# Altium footprint library PR_COR.PcbLib: 73 footprints (part 2 of 5)
Each footprint in its own frame and in the unit in brackets; x right, y up, seen from the top. Pads: shape width x height; smd on the part's side, far side on the other; paste and mask are expansions set on the pad; w line width, h text height; cw(c..) or ccw(c..) is an arc to the next point about the centre after c.
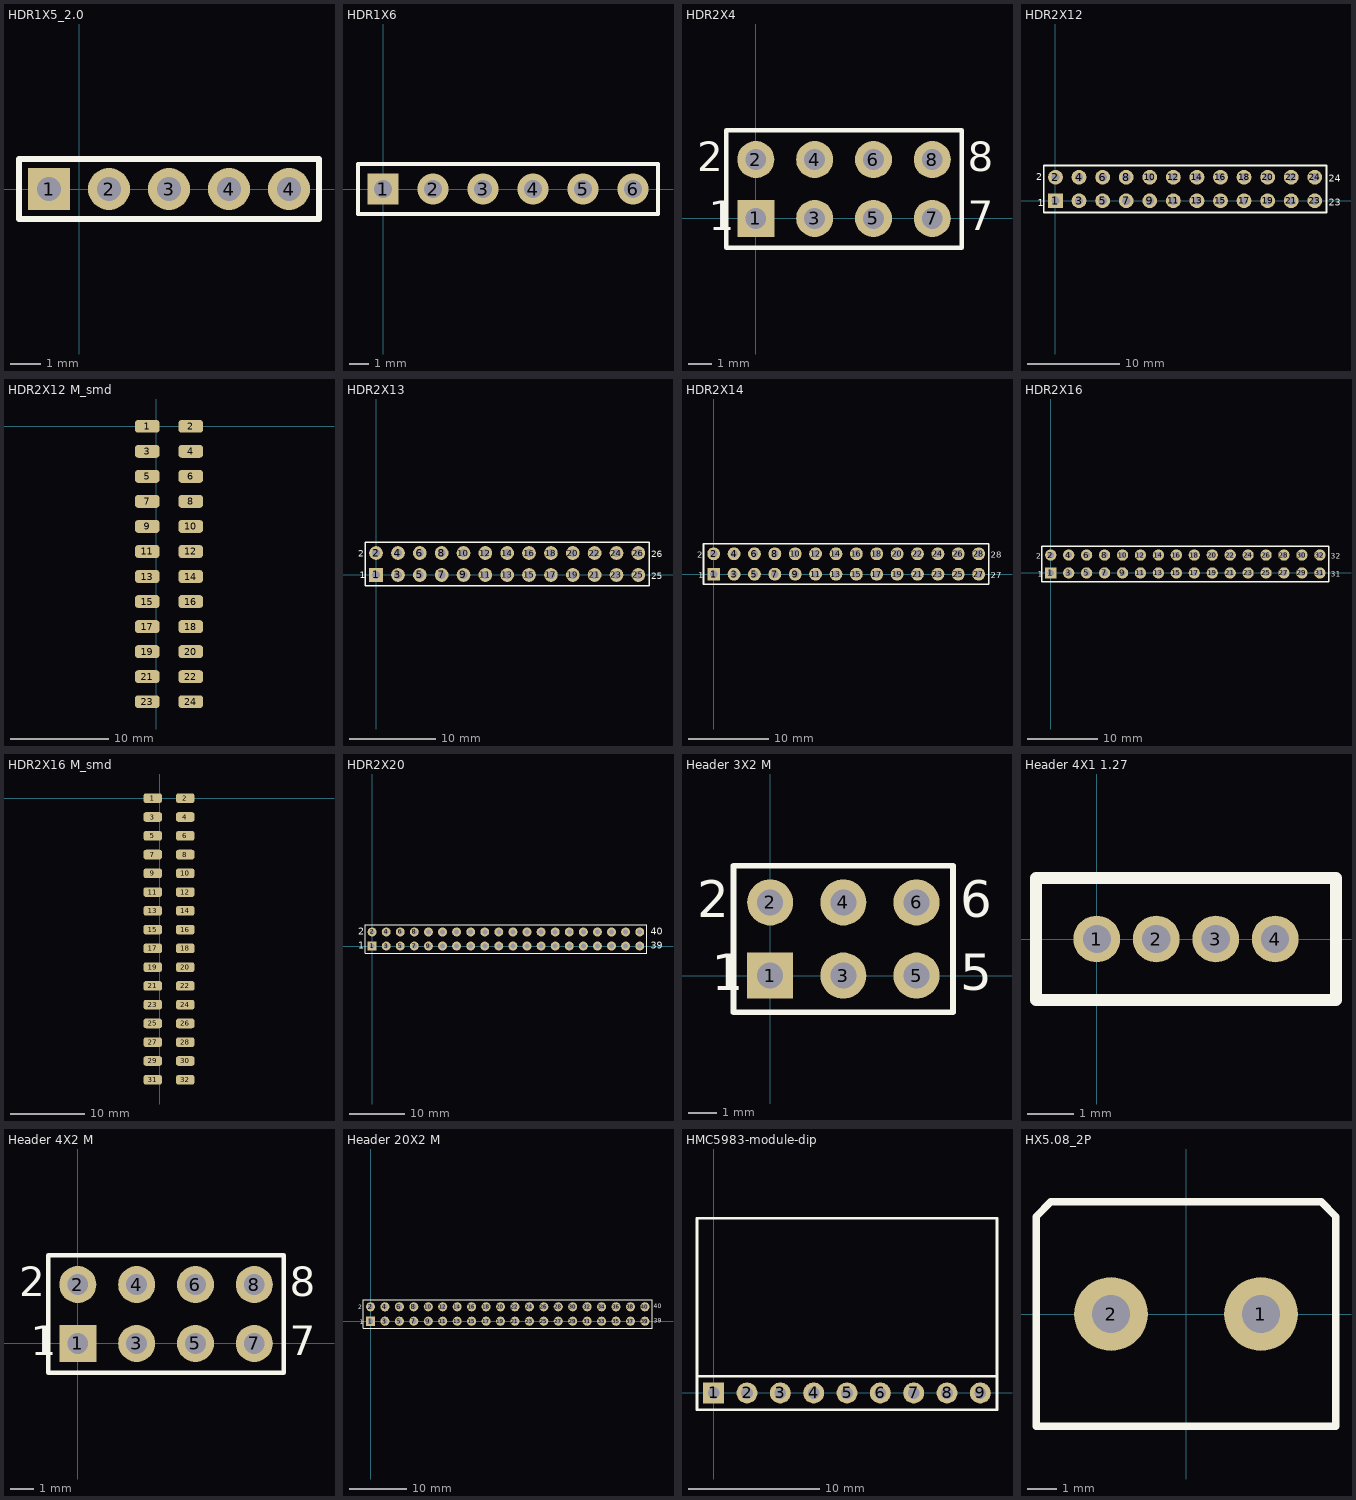
[diagram p1: the footprints below, top view; thin cyan lines are the x and y axes]

## HDR1X5_2.0 [mm] "Connector; Header; 2 Position"
pads (5):
  rect 1.4x1.4 hole 0.8: 1(-1,0)
  round 1.4 hole 0.8: 2(1,0) 3(3,0) 4(5,0) 4(7,0)
Top Overlay:
  lines w0.2: -2,-1 8,-1 8,1 -2,1 -2,-1
3D body: height 5.82, standoff -2.78, extent -2,-1 8,1

## HDR1X6 [mm] "Connector; Header; 6 Position"
pads (6):
  rect 1.6x1.6 hole 0.9: 1(0,0)
  round 1.6 hole 0.9: 2(2.54,0) 3(5.08,0) 4(7.62,0) 5(10.16,0) 6(12.7,0)
Top Overlay:
  lines w0.2: -1.27,-1.27 13.97,-1.27 13.97,1.27 -1.27,1.27 -1.27,-1.27
3D body: height 8.02, standoff -2.98, extent -1.27,-1.27 13.97,1.27

## HDR2X4 [mm] "Connector; Header; 4x2 Position"
pads (8):
  rect 1.6x1.6 hole 0.9: 1(0,0)
  round 1.6 hole 0.9: 2(0,2.54) 3(2.54,0) 4(2.54,2.54) 5(5.08,0) 6(5.08,2.54) 7(7.62,0) 8(7.62,2.54)
Top Overlay:
  lines w0.2: -1.27,-1.27 -1.27,3.81 8.89,3.81 8.89,-1.27 -1.27,-1.27
  text "8" at 9.144,2.032 h1.27
  text "7" at 9.144,-0.508 h1.27
  text "1" at -2.032,-0.508 h1.27
  text "2" at -2.54,2.032 h1.27
3D body: height 7.72, standoff -3.28, extent -1.27,-1.27 8.89,3.81

## HDR2X12 [mm] "Connector; Header; 12x2 Position"
pads (24):
  rect 1.6x1.6 hole 0.9: 1(0,0)
  round 1.6 hole 0.9: 2(0,2.54) 3(2.54,0) 4(2.54,2.54) 5(5.08,0) 6(5.08,2.54) 7(7.62,0) 8(7.62,2.54) 9(10.16,0) 10(10.16,2.54) 11(12.7,0) 12(12.7,2.54) 13(15.24,0) 14(15.24,2.54) 15(17.78,0) 16(17.78,2.54) 17(20.32,0) 18(20.32,2.54) 19(22.86,0) 20(22.86,2.54) 21(25.4,0) 22(25.4,2.54) 23(27.94,0) 24(27.94,2.54)
Top Overlay:
  lines w0.2: -1.27,-1.27 -1.27,3.81 29.21,3.81 29.21,-1.27 -1.27,-1.27
  text "1" at -1.9,-0.6 h0.76
  text "2" at -2.1,2.2 h0.76
  text "23" at 29.464,-0.508 h0.76
  text "24" at 29.464,2.032 h0.76
Bottom Overlay:
  lines w0.2: -1.27,-1.27 29.21,-1.27 29.21,3.81 -1.27,3.81 -1.27,-1.27
  text "24" at 30.76,2.01 h0.76
  text "23" at 30.75,-0.49 h0.76
  text "2" at -1.6,2.2 h0.76
  text "1" at -1.72,-0.62 h0.76
3D body: height 8.02, standoff -2.98, extent -1.27,-1.27 29.21,3.81

## HDR2X12 M_smd [mm]
pads (24):
  rrect50% 2.5x1.3 smd: 1(-0.93,0) 2(3.47,0) 3(-0.93,-2.54) 4(3.47,-2.54) 5(-0.93,-5.08) 6(3.47,-5.08) 7(-0.93,-7.62) 8(3.47,-7.62) 9(-0.93,-10.16) 10(3.47,-10.16) 11(-0.93,-12.7) 12(3.47,-12.7) 13(-0.93,-15.24) 14(3.47,-15.24) 15(-0.93,-17.78) 16(3.47,-17.78) 17(-0.93,-20.32) 18(3.47,-20.32) 19(-0.93,-22.86) 20(3.47,-22.86) 21(-0.93,-25.4) 22(3.47,-25.4) 23(-0.93,-27.94) 24(3.47,-27.94)
3D body: height 7.47, standoff 0.02, extent -2.03,-29.25 4.57,1.23

## HDR2X13 [mm] "Connector; Header; 13x2 Position"
pads (26):
  rect 1.6x1.6 hole 0.9: 1(0,0)
  round 1.6 hole 0.9: 2(0,2.54) 3(2.54,0) 4(2.54,2.54) 5(5.08,0) 6(5.08,2.54) 7(7.62,0) 8(7.62,2.54) 9(10.16,0) 10(10.16,2.54) 11(12.7,0) 12(12.7,2.54) 13(15.24,0) 14(15.24,2.54) 15(17.78,0) 16(17.78,2.54) 17(20.32,0) 18(20.32,2.54) 19(22.86,0) 20(22.86,2.54) 21(25.4,0) 22(25.4,2.54) 23(27.94,0) 24(27.94,2.54) 25(30.48,0) 26(30.48,2.54)
Top Overlay:
  lines w0.2: -1.27,-1.27 31.75,-1.27 31.75,3.81 -1.27,3.81 -1.27,-1.27
  text "26" at 32.004,2.032 h0.76
  text "25" at 32.004,-0.508 h0.76
  text "1" at -1.9,-0.4 h0.76
  text "2" at -2.1,2.1 h0.76
3D body: height 8.02, standoff -2.98, extent -1.27,-1.27 31.75,3.81

## HDR2X14 [mm] "Connector; Header; 14x2 Position"
pads (28):
  rect 1.6x1.6 hole 0.9: 1(0,0)
  round 1.6 hole 0.9: 2(0,2.54) 3(2.54,0) 4(2.54,2.54) 5(5.08,0) 6(5.08,2.54) 7(7.62,0) 8(7.62,2.54) 9(10.16,0) 10(10.16,2.54) 11(12.7,0) 12(12.7,2.54) 13(15.24,0) 14(15.24,2.54) 15(17.78,0) 16(17.78,2.54) 17(20.32,0) 18(20.32,2.54) 19(22.86,0) 20(22.86,2.54) 21(25.4,0) 22(25.4,2.54) 23(27.94,0) 24(27.94,2.54) 25(30.48,0) 26(30.48,2.54) 27(33.02,0) 28(33.02,2.54)
Top Overlay:
  lines w0.2: -1.27,-1.27 34.29,-1.27 34.29,3.81 -1.27,3.81 -1.27,-1.27
  text "28" at 34.544,2.032 h0.76
  text "27" at 34.544,-0.508 h0.76
  text "1" at -1.91,-0.51 h0.76
  text "2" at -2.08,2.032 h0.76
3D body: height 8.02, standoff -2.98, extent -1.27,-1.27 34.29,3.81

## HDR2X16 [mm] "Connector; Header; 16x2 Position"
pads (32):
  rect 1.6x1.6 hole 0.9: 1(0,0)
  round 1.6 hole 0.9: 2(0,2.54) 3(2.54,0) 4(2.54,2.54) 5(5.08,0) 6(5.08,2.54) 7(7.62,0) 8(7.62,2.54) 9(10.16,0) 10(10.16,2.54) 11(12.7,0) 12(12.7,2.54) 13(15.24,0) 14(15.24,2.54) 15(17.78,0) 16(17.78,2.54) 17(20.32,0) 18(20.32,2.54) 19(22.86,0) 20(22.86,2.54) 21(25.4,0) 22(25.4,2.54) 23(27.94,0) 24(27.94,2.54) 25(30.48,0) 26(30.48,2.54) 27(33.02,0) 28(33.02,2.54) 29(35.56,0) 30(35.56,2.54) 31(38.1,0) 32(38.1,2.54)
Top Overlay:
  lines w0.2: -1.27,-1.27 39.37,-1.27 39.37,3.81 -1.27,3.81 -1.27,-1.27
  text "2" at -2.09,2.032 h0.76
  text "1" at -1.86,-0.5 h0.76
  text "31" at 39.624,-0.508 h0.76
  text "32" at 39.624,2.032 h0.76
Bottom Overlay:
  lines w0.2: -1.27,-1.27 -1.27,3.81 39.37,3.81 39.37,-1.27 -1.27,-1.27
  text "32" at 40.88,2.04 h0.76
  text "31" at 40.64,-0.5 h0.76
  text "1" at -1.63,-0.5 h0.76
  text "2" at -1.61,2.03 h0.76
3D body: height 8.02, standoff -2.98, extent -1.263,-1.27 39.377,3.81

## HDR2X16 M_smd [mm]
pads (32):
  rrect50% 2.5x1.3 smd: 1(-0.93,0) 2(3.47,0) 3(-0.93,-2.54) 4(3.47,-2.54) 5(-0.93,-5.08) 6(3.47,-5.08) 7(-0.93,-7.62) 8(3.47,-7.62) 9(-0.93,-10.16) 10(3.47,-10.16) 11(-0.93,-12.7) 12(3.47,-12.7) 13(-0.93,-15.24) 14(3.47,-15.24) 15(-0.93,-17.78) 16(3.47,-17.78) 17(-0.93,-20.32) 18(3.47,-20.32) 19(-0.93,-22.86) 20(3.47,-22.86) 21(-0.93,-25.4) 22(3.47,-25.4) 23(-0.93,-27.94) 24(3.47,-27.94) 25(-0.93,-30.48) 26(3.47,-30.48) 27(-0.93,-33.02) 28(3.47,-33.02) 29(-0.93,-35.56) 30(3.47,-35.56) 31(-0.93,-38.1) 32(3.47,-38.1)
3D body: height 7.47, standoff 0.02, extent -2.03,-39.37 4.57,1.27

## HDR2X20 [mm] "Connector; Header; 20x2 Position"
pads (40):
  rect 1.6x1.6 hole 0.9: 1(0,0)
  round 1.6 hole 0.9: 2(0,2.54) 3(2.54,0) 4(2.54,2.54) 5(5.08,0) 6(5.08,2.54) 7(7.62,0) 8(7.62,2.54) 9(10.16,0) 10(10.16,2.54) 11(12.7,0) 12(12.7,2.54) 13(15.24,0) 14(15.24,2.54) 15(17.78,0) 16(17.78,2.54) 17(20.32,0) 18(20.32,2.54) 19(22.86,0) 20(22.86,2.54) 21(25.4,0) 22(25.4,2.54) 23(27.94,0) 24(27.94,2.54) 25(30.48,0) 26(30.48,2.54) 27(33.02,0) 28(33.02,2.54) 29(35.56,0) 30(35.56,2.54) 31(38.1,0) 32(38.1,2.54) 33(40.64,0) 34(40.64,2.54) 35(43.18,0) 36(43.18,2.54) 37(45.72,0) 38(45.72,2.54) 39(48.26,0) 40(48.26,2.54)
Top Overlay:
  lines w0.2: -1.27,-1.27 49.53,-1.27 49.53,3.81 -1.27,3.81 -1.27,-1.27
  text "1" at -2.54,-0.508 h1.27
  text "2" at -2.54,2.032 h1.27
  text "40" at 50.292,2.032 h1.27
  text "39" at 50.292,-0.508 h1.27
3D body: height 8.02, standoff -2.98, extent -1.27,-1.27 49.53,3.81

## Header 3X2 M [mm] "Connector; Header; 3x2 Position"
pads (6):
  rect 1.6x1.6 hole 0.9: 1(0,0)
  round 1.6 hole 0.9: 2(0,2.54) 3(2.54,0) 4(2.54,2.54) 5(5.08,0) 6(5.08,2.54)
Top Overlay:
  lines w0.2: 1.482,-1.27 6.35,-1.27 ; 6.35,-1.27 -1.27,-1.27 -1.27,3.81 6.35,3.81 6.35,-1.27
  text "1" at -2.032,-0.508 h1.27
  text "2" at -2.54,2.032 h1.27
  text "5" at 6.604,-0.508 h1.27
  text "6" at 6.604,2.032 h1.27
3D body: height 7.12, standoff -2.58, extent -1.27,-1.27 6.35,3.81

## Header 4X1 1.27 [mm]
pads (4):
  round 1 hole 0.6: 1(0,0) 2(1.27,0) 3(2.54,0) 4(3.81,0)
Top Overlay:
  lines w0.254: -1.3,-1.3 -1.3,1.3 5.11,1.3 5.11,-1.3 -1.3,-1.3

## Header 4X2 M [mm] "Connector; Header; 4x2 Position"
pads (8):
  rect 1.6x1.6 hole 0.9: 1(0,0)
  round 1.6 hole 0.9: 2(0,2.54) 3(2.54,0) 4(2.54,2.54) 5(5.08,0) 6(5.08,2.54) 7(7.62,0) 8(7.62,2.54)
Top Overlay:
  lines w0.2: -1.27,-1.27 8.89,-1.27 8.89,3.81 -1.27,3.81 -1.27,-1.27
  text "2" at -2.54,2.032 h1.27
  text "1" at -2.032,-0.508 h1.27
  text "7" at 9.144,-0.508 h1.27
  text "8" at 9.144,2.032 h1.27
3D body: height 7.12, standoff -2.58, extent -1.27,-1.27 8.89,3.81

## Header 20X2 M [mm] "Connector; Header; 20x2 Position"
pads (40):
  rect 1.6x1.6 hole 0.9: 1(0,0)
  round 1.6 hole 0.9: 2(0,2.54) 3(2.54,0) 4(2.54,2.54) 5(5.08,0) 6(5.08,2.54) 7(7.62,0) 8(7.62,2.54) 9(10.16,0) 10(10.16,2.54) 11(12.7,0) 12(12.7,2.54) 13(15.24,0) 14(15.24,2.54) 15(17.78,0) 16(17.78,2.54) 17(20.32,0) 18(20.32,2.54) 19(22.86,0) 20(22.86,2.54) 21(25.4,0) 22(25.4,2.54) 23(27.94,0) 24(27.94,2.54) 25(30.48,0) 26(30.48,2.54) 27(33.02,0) 28(33.02,2.54) 29(35.56,0) 30(35.56,2.54) 31(38.1,0) 32(38.1,2.54) 33(40.64,0) 34(40.64,2.54) 35(43.18,0) 36(43.18,2.54) 37(45.72,0) 38(45.72,2.54) 39(48.26,0) 40(48.26,2.54)
Top Overlay:
  lines w0.2: -1.27,-1.27 49.53,-1.27 49.53,3.81 -1.27,3.81 -1.27,-1.27
  text "1" at -1.9,-0.5 h0.76
  text "2" at -2.2,2.1 h0.76
  text "40" at 49.8,2.3 h0.76
  text "39" at 49.792,-0.308 h0.76
Bottom Overlay:
  lines w0.2: -1.27,-1.27 -1.27,3.81 49.53,3.81 49.53,-1.27 -1.27,-1.27
  text "39" at 51.1,-0.3 h0.76
  text "40" at 51.2,2.3 h0.76
  text "2" at -1.7,2.1 h0.76
  text "1" at -1.8,-0.5 h0.76
3D body: height 7.12, standoff -2.58, extent -1.27,-1.27 49.53,3.81

## HMC5983-module-dip [mm] "Connector; Header; 9 Position"
pads (9):
  rect 1.6x1.6 hole 0.9: 1(0,0)
  round 1.6 hole 0.9: 2(2.54,0) 3(5.08,0) 4(7.62,0) 5(10.16,0) 6(12.7,0) 7(15.24,0) 8(17.78,0) 9(20.32,0)
Top Overlay:
  lines w0.2: -1.27,1.27 -1.27,13.3 21.59,13.3 21.59,1.27 ; -1.27,1.27 21.59,1.27 ; -1.27,1.27 -1.27,-1.27 21.59,-1.27 21.59,1.27

## HX5.08_2P [mm]
pads (2):
  round 2.5 hole 1.3: 1(2.54,0) 2(-2.54,0)
Top Overlay:
  lines w0.254: -5.08,-3.8 5.08,-3.8 5.08,3.3 4.58,3.8 -4.58,3.8 -5.08,3.3 -5.08,-3.8
3D body: height 10.02, standoff -3.78, extent -5.08,-3.8 5.58,3.8